# Altium footprint library ICs_rus.PCBLIB: 103 footprints (part 4 of 7)
Each footprint in its own frame and in the unit in brackets; x right, y up, seen from the top. Pads: shape width x height; smd on the part's side, far side on the other; paste and mask are expansions set on the pad; w line width, h text height; cw(c..) or ccw(c..) is an arc to the next point about the centre after c.
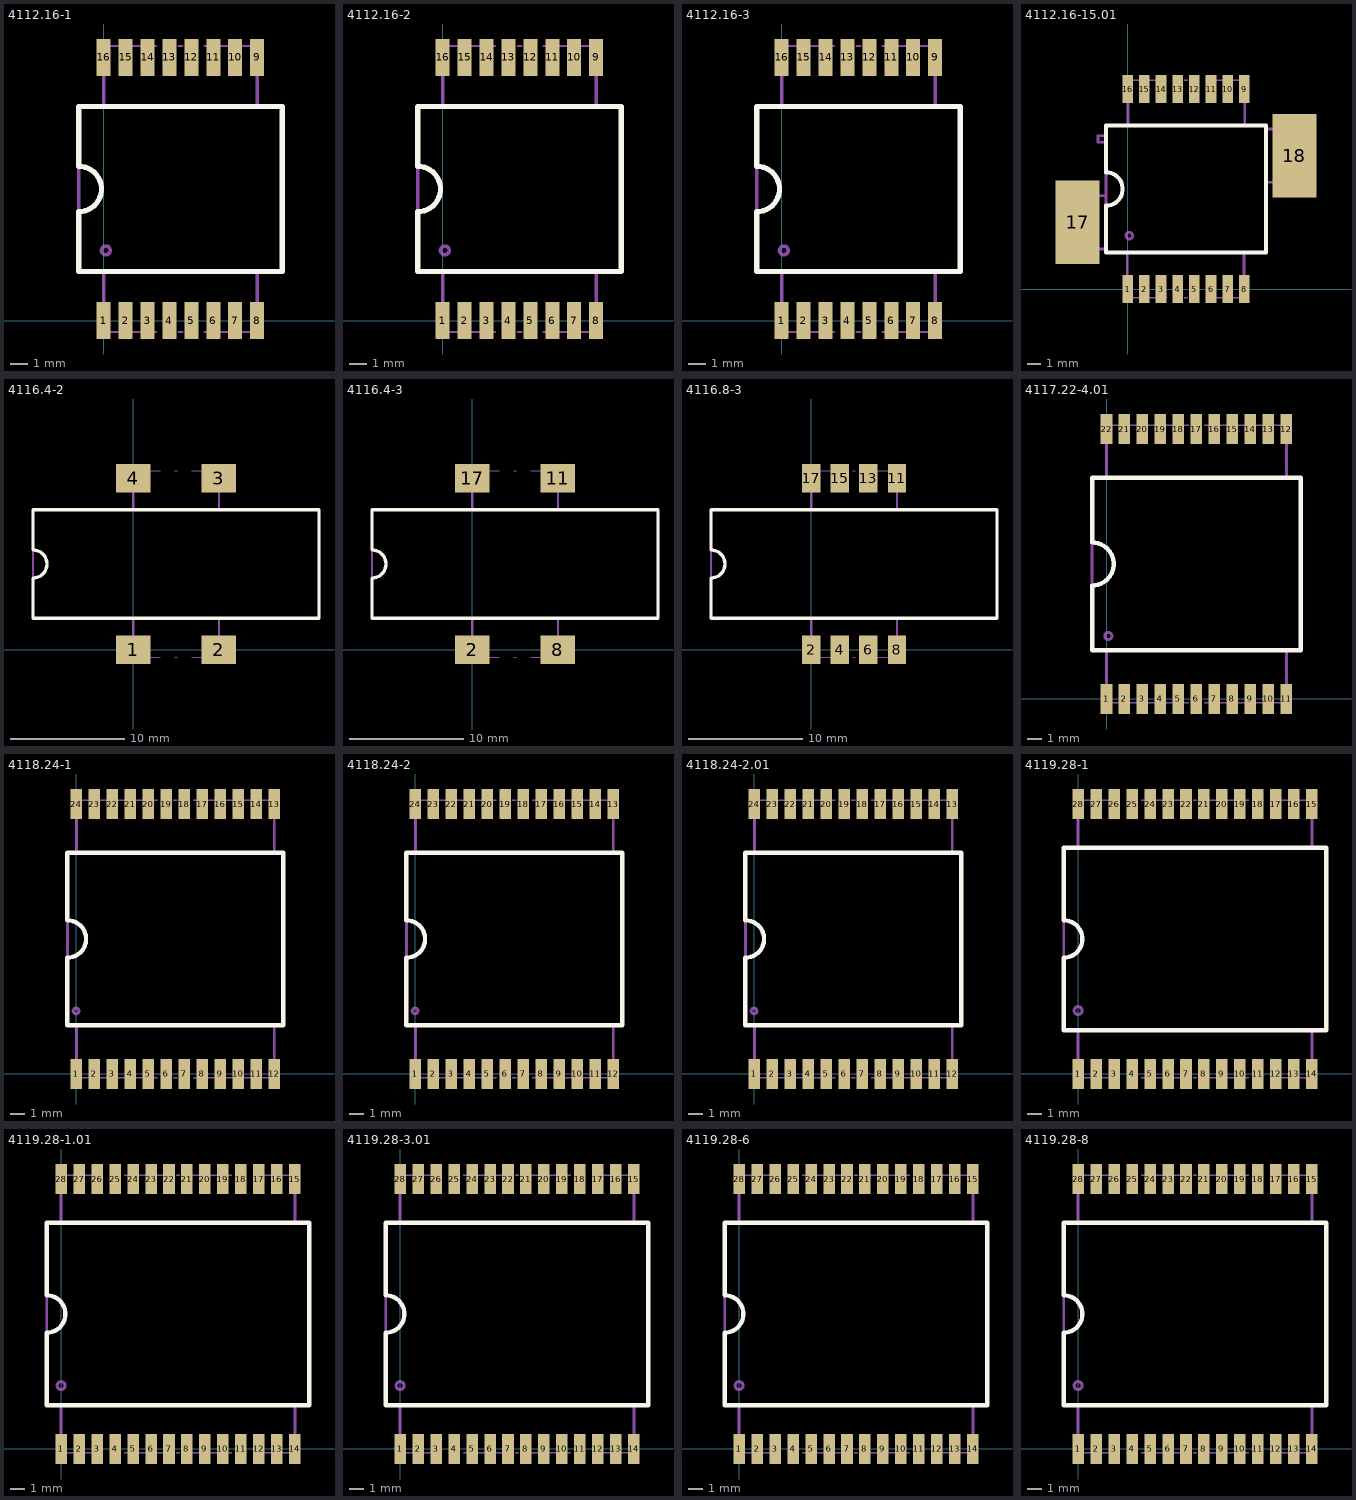
[diagram p3: the footprints below, top view; thin cyan lines are the x and y axes]

## 4112.16-1 [mm]
pads (16):
  rect 0.8x2.1 smd: 1(0,0) 2(1.25,0) 3(2.5,0) 4(3.75,0) 5(5,0) 6(6.25,0) 7(7.5,0) 8(8.75,0) 9(8.75,15) 10(7.5,15) 11(6.25,15) 12(5,15) 13(3.75,15) 14(2.5,15) 15(1.25,15) 16(0,15)
Top Overlay:
  lines w0.3: -1.425,2.8 -1.425,6.2 ccw(c-1.425,7.5) -1.425,8.8 -1.425,12.2 10.175,12.2 10.175,2.8 -1.425,2.8
Mechanical 1:
  circle w0.2: c0.125,4 r0.25
  lines w0.1: 0,-0.65 3,-0.65 ; 0,15.65 3,15.65 ; 4.25,-0.65 4.5,-0.65 ; 4.25,15.65 4.5,15.65 ; 5.75,-0.65 8.75,-0.65 ; 5.75,15.65 8.75,15.65
  lines w0.2: 0,-0.65 0,2.75 ; 0,12.2 0,15.65 ; 8.75,-0.65 8.75,2.75 ; 8.75,12.2 8.75,15.65 ; 10.175,12.175 10.175,2.8 -1.425,2.8 -1.425,12.2 10.175,12.2
  text ".Designator" at 3,8.2 h1.5
  text ".Comment" at 1.1,6.1 h1.5
  text "16" at -0.198,12.946 h1.5
3D body: height 2.8, standoff 0, extent -1.4,-0.6 10.2,15.7

## 4112.16-2 [mm]
pads (16):
  rect 0.8x2.1 smd: 1(0,0) 2(1.25,0) 3(2.5,0) 4(3.75,0) 5(5,0) 6(6.25,0) 7(7.5,0) 8(8.75,0) 9(8.75,15) 10(7.5,15) 11(6.25,15) 12(5,15) 13(3.75,15) 14(2.5,15) 15(1.25,15) 16(0,15)
Top Overlay:
  lines w0.3: -1.425,2.8 10.175,2.8 10.175,12.2 -1.425,12.2 -1.425,8.8 cw(c-1.425,7.5) -1.425,6.2 -1.425,2.8
Mechanical 1:
  circle w0.2: c0.125,4 r0.25
  lines w0.1: 0,-0.65 3,-0.65 ; 0,15.65 3,15.65 ; 4.25,-0.65 4.5,-0.65 ; 4.25,15.65 4.5,15.65 ; 5.75,-0.65 8.75,-0.65 ; 5.75,15.65 8.75,15.65
  lines w0.2: 0,-0.65 0,2.75 ; 0,12.2 0,15.65 ; 8.75,-0.65 8.75,2.75 ; 8.75,12.2 8.75,15.65 ; 10.175,12.175 10.175,2.8 -1.425,2.8 -1.425,12.2 10.175,12.2
  text ".Designator" at 3.6,8.3 h1.5
  text ".Comment" at 1.7,6.2 h1.5
  text "16" at 0.126,12.493 h1.5
3D body: height 2.8, standoff 0, extent -1.4,-0.6 10.2,15.7

## 4112.16-3 [mm]
pads (16):
  rect 0.8x2.1 smd: 1(0,0) 2(1.25,0) 3(2.5,0) 4(3.75,0) 5(5,0) 6(6.25,0) 7(7.5,0) 8(8.75,0) 9(8.75,15) 10(7.5,15) 11(6.25,15) 12(5,15) 13(3.75,15) 14(2.5,15) 15(1.25,15) 16(0,15)
Top Overlay:
  lines w0.3: -1.425,2.8 10.175,2.8 10.175,12.2 -1.425,12.2 -1.425,8.8 cw(c-1.425,7.5) -1.425,6.2 -1.425,2.8
Mechanical 1:
  circle w0.2: c0.125,4 r0.25
  lines w0.1: 0,-0.65 3,-0.65 ; 0,15.65 3,15.65 ; 4.25,-0.65 4.5,-0.65 ; 4.25,15.65 4.5,15.65 ; 5.75,-0.65 8.75,-0.65 ; 5.75,15.65 8.75,15.65
  lines w0.2: 0,-0.65 0,2.75 ; 0,12.2 0,15.65 ; 8.75,-0.65 8.75,2.75 ; 8.75,12.2 8.75,15.65 ; 10.175,12.175 10.175,2.8 -1.425,2.8 -1.425,12.2 10.175,12.2
  text ".Designator" at 3.2,8.3 h1.5
  text ".Comment" at 1.3,6.2 h1.5
  text "16" at -0.198,12.946 h1.5
3D body: height 2.8, standoff 0, extent -1.4,-0.6 10.2,15.7

## 4112.16-15.01 [mm]
pads (18):
  rect 0.8x2.1 smd: 1(0,0) 2(1.25,0) 3(2.5,0) 4(3.75,0) 5(5,0) 6(6.25,0) 7(7.5,0) 8(8.75,0) 9(8.75,15) 10(7.5,15) 11(6.25,15) 12(5,15) 13(3.75,15) 14(2.5,15) 15(1.25,15) 16(0,15)
  rect 3.3x6.25 smd: 17(-3.75,5) 18(12.5,10)
Top Overlay:
  lines w0.3: -1.625,2.75 -1.625,6.25 ccw(c-1.625,7.5) -1.625,8.75 -1.625,12.25 10.375,12.25 10.375,2.75 -1.625,2.75
Mechanical 1:
  circle w0.2: c0.125,4 r0.25
  lines w0.1: -0.025,-0.65 2.925,-0.65 ; 0.025,15.7 0.025,15.65 2.875,15.65 ; 4.225,-0.65 4.525,-0.65 ; 4.225,15.65 4.525,15.65 ; 5.825,15.65 8.775,15.65 ; 5.875,-0.65 8.725,-0.65 8.725,-0.7
  lines w0.2: -1.625,3 -4.125,3 -4.125,7 -1.625,7 ; -1.625,11 -2.225,11 -2.225,11.5 -1.625,11.5 ; -0.025,-0.65 -0.025,2.75 ; 0.025,12.25 0.025,15.65 ; 8.725,-0.65 8.725,2.75 ; 8.775,12.25 8.775,15.65 ; 10.375,8 12.875,8 12.875,12 10.375,12 ; -1.625,2.75 -1.625,12.25 10.375,12.25 10.375,2.75 -1.625,2.75
  text ".Designator" at 3.3,8.1 h1.5
  text ".Comment" at 1.4,6 h1.5
  text "16" at -0.148,12.7 h1.5
3D body: height 3.46, standoff 0, extent -4.1,-0.6 12.9,15.7

## 4116.4-2 [mm]
height 3.35
pads (4):
  rect 3x2.5 smd: 1(0,0) 2(7.5,0) 3(7.5,15) 4(0,15)
Top Overlay:
  lines w0.3: -8.75,2.75 -8.75,6.275 ccw(c-8.75,7.5) -8.75,8.725 -8.75,12.25 16.25,12.25 16.25,2.75 -8.75,2.75
Mechanical 1:
  lines w0.1: 0,-0.65 2.375,-0.65 ; 0,15.65 2.375,15.65 ; 3.625,-0.65 3.875,-0.65 ; 3.625,15.65 3.875,15.65 ; 5.125,-0.65 7.5,-0.65 ; 5.125,15.65 7.5,15.65
  lines w0.2: 0,-0.65 0,2.775 ; 0,12.225 0,15.65 ; 7.5,-0.65 7.5,2.775 ; 7.5,12.225 7.5,15.65 ; -8.75,2.75 -8.75,12.25 16.25,12.25 16.25,2.75 -8.75,2.75
  text "2" at -0.724,3.571 h1.5
  text "17" at -1.448,9.821 h1.5
  text "8" at 6.776,3.571 h1.5
  text "11" at 6.052,9.821 h1.5
  text ".Comment" at -0.6,5.8 h1.5
  text ".Designator" at 1.3,7.9 h1.5
3D body: height 3.1, standoff 0, extent -8.8,-0.7 16.2,15.6

## 4116.4-3 [mm]
pads (4):
  rect 3x2.5 smd: 2(0,0) 8(7.5,0) 11(7.5,15) 17(0,15)
Top Overlay:
  lines w0.3: -8.75,2.75 -8.75,6.275 ccw(c-8.75,7.5) -8.75,8.725 -8.75,12.25 16.25,12.25 16.25,2.75 -8.75,2.75
Mechanical 1:
  lines w0.1: 0,-0.65 2.375,-0.65 ; 0,15.65 2.375,15.65 ; 3.625,-0.65 3.875,-0.65 ; 3.625,15.65 3.875,15.65 ; 5.125,-0.65 7.5,-0.65 ; 5.125,15.65 7.5,15.65
  lines w0.2: 0,-0.65 0,2.775 ; 0,12.225 0,15.65 ; 7.5,-0.65 7.5,2.775 ; 7.5,12.225 7.5,15.65 ; -8.75,2.75 -8.75,12.25 16.25,12.25 16.25,2.75 -8.75,2.75
  text ".Designator" at 1.9,7.8 h1.5
  text ".Comment" at 0,5.7 h1.5
  text "2" at -0.724,3.571 h1.5
  text "17" at -1.448,9.821 h1.5
  text "8" at 6.776,3.571 h1.5
  text "11" at 6.052,9.821 h1.5
3D body: height 3.35, standoff 0, extent -8.7,-0.7 16.3,15.6

## 4116.8-3 [mm]
pads (8):
  rect 1.6x2.5 smd: 2(0,0) 4(2.5,0) 6(5,0) 8(7.5,0) 11(7.5,15) 13(5,15) 15(2.5,15) 17(0,15)
Top Overlay:
  lines w0.3: -8.75,2.75 16.25,2.75 16.25,12.25 -8.75,12.25 -8.75,8.725 cw(c-8.75,7.5) -8.75,6.275 -8.75,2.75
Mechanical 1:
  lines w0.1: 0,-0.65 2.375,-0.65 ; 0,15.65 2.375,15.65 ; 3.625,-0.65 3.875,-0.65 ; 3.625,15.65 3.875,15.65 ; 5.125,-0.65 7.5,-0.65 ; 5.125,15.65 7.5,15.65
  lines w0.2: 0,-0.65 0,2.775 ; 0,12.225 0,15.65 ; 7.5,-0.65 7.5,2.775 ; 7.5,12.225 7.5,15.65 ; -8.75,2.75 16.25,2.75 16.25,12.25 -8.75,12.25 -8.75,2.75
  text "15" at 1.052,9.821 h1.5
  text "4" at 1.776,3.571 h1.5
  text "11" at 6.052,9.821 h1.5
  text "13" at 3.552,9.821 h1.5
  text "8" at 6.776,3.571 h1.5
  text "6" at 4.276,3.571 h1.5
  text "17" at -1.448,9.821 h1.5
  text "2" at -0.724,3.571 h1.5
  text ".Comment" at 0,5.7 h1.5
  text ".Designator" at 1.9,7.8 h1.5
3D body: height 3.35, standoff 0, extent -8.8,-0.7 16.2,15.6

## 4117.22-4.01 [mm]
pads (22):
  rect 0.8x2.1 smd: 1(0,0) 2(1.25,0) 3(2.5,0) 4(3.75,0) 5(5,0) 6(6.25,0) 7(7.5,0) 8(8.75,0) 9(10,0) 10(11.25,0) 11(12.5,0) 12(12.5,18.75) 13(11.25,18.75) 14(10,18.75) 15(8.75,18.75) 16(7.5,18.75) 17(6.25,18.75) 18(5,18.75) 19(3.75,18.75) 20(2.5,18.75) 21(1.25,18.75) 22(0,18.75)
Top Overlay:
  lines w0.3: -1,3.375 -1,7.875 ccw(c-1,9.375) -1,10.875 -1,15.375 ; -1,3.375 13.5,3.375 ; -1,3.375 13.5,3.375 ; -1,15.375 13.5,15.375 ; -1,15.375 13.5,15.375 ; 13.5,3.375 13.5,15.375
Mechanical 1:
  circle w0.2: c0.125,4.375 r0.25
  lines w0.1: 0,-0.275 5.7,-0.275 ; 0,19.025 5.7,19.025 ; 6.1,-0.275 6.4,-0.275 ; 6.1,19.025 6.4,19.025 ; 6.8,-0.275 12.5,-0.275 ; 6.8,19.025 12.5,19.025
  lines w0.2: -1,3.375 -1,15.375 ; 0,-0.275 0,3.375 ; 0,15.375 0,19.025 ; 12.5,-0.275 12.5,3.375 ; 12.5,15.375 12.5,19.025 ; 13.5,3.375 13.5,15.375
  text ".Designator" at 4.8,10.5 h1.5
  text ".Comment" at 2.9,8.4 h1.5
  text "22" at 0.751,15.618 h1.5
3D body: height 3.21, standoff 0, extent -1.2,-0.3 13.8,19

## 4118.24-1 [mm]
pads (24):
  rect 0.8x2.1 smd: 1(0,0) 2(1.25,0) 3(2.5,0) 4(3.75,0) 5(5,0) 6(6.25,0) 7(7.5,0) 8(8.75,0) 9(10,0) 10(11.25,0) 11(12.5,0) 12(13.75,0) 13(13.75,18.75) 14(12.5,18.75) 15(11.25,18.75) 16(10,18.75) 17(8.75,18.75) 18(7.5,18.75) 19(6.25,18.75) 20(5,18.75) 21(3.75,18.75) 22(2.5,18.75) 23(1.25,18.75) 24(0,18.75)
Top Overlay:
  lines w0.3: -0.625,8.05 -0.625,3.375 14.375,3.375 14.375,15.375 -0.625,15.375 -0.625,10.675 cw(c-0.625,9.375) -0.625,8.075
Mechanical 1:
  circle w0.2: c-0.025,4.375 r0.2
  lines w0.1: 0,-0.275 5.625,-0.275 ; 0,19.025 5.625,19.025 ; 6.75,-0.275 7,-0.275 ; 6.75,19.025 7,19.025 ; 8.125,-0.275 13.75,-0.275 ; 8.125,19.025 13.75,19.025
  lines w0.2: 0,-0.275 0,3.375 ; 0,15.375 0,19.025 ; 13.75,-0.275 13.75,3.375 ; 13.75,15.375 13.75,19.025 ; -0.625,3.375 -0.625,15.375 14.375,15.375 14.375,3.375 -0.625,3.375
  text "24" at 0.427,16.696 h1.5
  text ".Comment" at 3.7,8.3 h1.5
  text ".Designator" at 5.6,10.4 h1.5
3D body: height 2.5, standoff 0, extent -0.8,-0.3 14.6,19

## 4118.24-2 [mm]
pads (24):
  rect 0.8x2.1 smd: 1(0,0) 2(1.25,0) 3(2.5,0) 4(3.75,0) 5(5,0) 6(6.25,0) 7(7.5,0) 8(8.75,0) 9(10,0) 10(11.25,0) 11(12.5,0) 12(13.75,0) 13(13.75,18.75) 14(12.5,18.75) 15(11.25,18.75) 16(10,18.75) 17(8.75,18.75) 18(7.5,18.75) 19(6.25,18.75) 20(5,18.75) 21(3.75,18.75) 22(2.5,18.75) 23(1.25,18.75) 24(0,18.75)
Top Overlay:
  lines w0.3: -0.625,8.05 -0.625,3.375 14.375,3.375 14.375,15.375 -0.625,15.375 -0.625,10.675 cw(c-0.625,9.375) -0.625,8.075
Mechanical 1:
  circle w0.2: c-0.025,4.375 r0.2
  lines w0.1: 0,-0.275 5.625,-0.275 ; 0,19.025 5.625,19.025 ; 6.75,-0.275 7,-0.275 ; 6.75,19.025 7,19.025 ; 8.125,-0.275 13.75,-0.275 ; 8.125,19.025 13.75,19.025
  lines w0.2: 0,-0.275 0,3.375 ; 0,15.375 0,19.025 ; 13.75,-0.275 13.75,3.375 ; 13.75,15.375 13.75,19.025 ; -0.625,3.375 14.375,3.375 14.375,15.375 -0.625,15.375 -0.625,3.375
  text ".Designator" at 5.4,10.5 h1.5
  text ".Comment" at 3.5,8.4 h1.5
  text "24" at 0.751,16.243 h1.5
3D body: height 2.5, standoff 0, extent -0.8,-0.3 14.6,19

## 4118.24-2.01 [mm]
pads (24):
  rect 0.8x2.1 smd: 1(0,0) 2(1.25,0) 3(2.5,0) 4(3.75,0) 5(5,0) 6(6.25,0) 7(7.5,0) 8(8.75,0) 9(10,0) 10(11.25,0) 11(12.5,0) 12(13.75,0) 13(13.75,18.75) 14(12.5,18.75) 15(11.25,18.75) 16(10,18.75) 17(8.75,18.75) 18(7.5,18.75) 19(6.25,18.75) 20(5,18.75) 21(3.75,18.75) 22(2.5,18.75) 23(1.25,18.75) 24(0,18.75)
Top Overlay:
  lines w0.3: -0.625,8.05 -0.625,3.375 14.375,3.375 14.375,15.375 -0.625,15.375 -0.625,10.675 cw(c-0.625,9.375) -0.625,8.075
Mechanical 1:
  circle w0.2: c-0.025,4.375 r0.2
  lines w0.1: 0,-0.275 5.625,-0.275 ; 0,19.025 5.625,19.025 ; 6.75,-0.275 7,-0.275 ; 6.75,19.025 7,19.025 ; 8.125,-0.275 13.75,-0.275 ; 8.125,19.025 13.75,19.025
  lines w0.2: 0,-0.275 0,3.375 ; 0,15.375 0,19.025 ; 13.75,-0.275 13.75,3.375 ; 13.75,15.375 13.75,19.025 ; -0.625,3.375 -0.625,15.375 14.375,15.375 14.375,3.375 -0.625,3.375
  text ".Designator" at 5.7,10.3 h1.5
  text ".Comment" at 3.8,8.2 h1.5
  text "24" at 0.751,16.243 h1.5
3D body: height 2.5, standoff 0, extent -0.8,-0.3 14.6,19

## 4119.28-1 [mm]
pads (28):
  rect 0.8x2.1 smd: 1(0,0) 2(1.25,0) 3(2.5,0) 4(3.75,0) 5(5,0) 6(6.25,0) 7(7.5,0) 8(8.75,0) 9(10,0) 10(11.25,0) 11(12.5,0) 12(13.75,0) 13(15,0) 14(16.25,0) 15(16.25,18.75) 16(15,18.75) 17(13.75,18.75) 18(12.5,18.75) 19(11.25,18.75) 20(10,18.75) 21(8.75,18.75) 22(7.5,18.75) 23(6.25,18.75) 24(5,18.75) 25(3.75,18.75) 26(2.5,18.75) 27(1.25,18.75) 28(0,18.75)
Top Overlay:
  lines w0.3: -1,3.025 -1,8.075 ccw(c-1,9.375) -1,10.675 -1,15.725 17.25,15.725 17.25,3.025 -1,3.025
Mechanical 1:
  circle w0.2: c0,4.4 r0.275
  lines w0.1: 0,-0.275 2.625,-0.275 ; 0,19.025 2.625,19.025 ; 3.375,-0.275 3.625,-0.275 ; 3.375,19.025 3.625,19.025 ; 4.375,-0.275 7.125,-0.275 ; 4.375,19.025 7.125,19.025 ; 8,-0.275 8.25,-0.275 ; 8,19.025 8.25,19.025 ; 9.125,-0.275 11.875,-0.275 ; 9.125,19.025 11.875,19.025 ; 12.625,-0.275 12.875,-0.275 ; 12.625,19.025 12.875,19.025 ; 13.625,-0.275 16.25,-0.275 ; 13.625,19.025 16.25,19.025
  lines w0.2: 0,-0.275 0,3.025 ; 0,15.725 0,19.025 ; 16.25,-0.275 16.25,3.025 ; 16.25,15.725 16.25,19.025 ; -1,3.025 -1,15.725 17.25,15.725 17.25,3.025 -1,3.025
  text "28" at 0.427,16.696 h1.5
  text ".Comment" at 4.6,8.1 h1.5
  text ".Designator" at 6.5,10.2 h1.5
3D body: height 2.5, standoff 0, extent -1,-0.3 17.25,19

## 4119.28-1.01 [mm]
pads (28):
  rect 0.8x2.1 smd: 1(0,0) 2(1.25,0) 3(2.5,0) 4(3.75,0) 5(5,0) 6(6.25,0) 7(7.5,0) 8(8.75,0) 9(10,0) 10(11.25,0) 11(12.5,0) 12(13.75,0) 13(15,0) 14(16.25,0) 15(16.25,18.75) 16(15,18.75) 17(13.75,18.75) 18(12.5,18.75) 19(11.25,18.75) 20(10,18.75) 21(8.75,18.75) 22(7.5,18.75) 23(6.25,18.75) 24(5,18.75) 25(3.75,18.75) 26(2.5,18.75) 27(1.25,18.75) 28(0,18.75)
Top Overlay:
  lines w0.3: -1,3.025 17.25,3.025 17.25,15.725 -1,15.725 -1,10.675 cw(c-1,9.375) -1,8.075 -1,3.025
Mechanical 1:
  circle w0.2: c0,4.4 r0.275
  lines w0.1: 0,-0.275 2.625,-0.275 ; 0,19.025 2.625,19.025 ; 3.375,-0.275 3.625,-0.275 ; 3.375,19.025 3.625,19.025 ; 4.375,-0.275 7.125,-0.275 ; 4.375,19.025 7.125,19.025 ; 8,-0.275 8.25,-0.275 ; 8,19.025 8.25,19.025 ; 9.125,-0.275 11.875,-0.275 ; 9.125,19.025 11.875,19.025 ; 12.625,-0.275 12.875,-0.275 ; 12.625,19.025 12.875,19.025 ; 13.625,-0.275 16.25,-0.275 ; 13.625,19.025 16.25,19.025
  lines w0.2: 0,-0.275 0,3.025 ; 0,15.725 0,19.025 ; 16.25,-0.275 16.25,3.025 ; 16.25,15.725 16.25,19.025 ; -1,3.025 17.25,3.025 17.25,15.725 -1,15.725 -1,3.025
  text ".Designator" at 6.8,10.1 h1.5
  text ".Comment" at 4.9,8 h1.5
  text "28" at 0.751,16.243 h1.5
3D body: height 2.5, standoff 0, extent -1,-0.3 17.25,19

## 4119.28-3.01 [mm]
pads (28):
  rect 0.8x2.1 smd: 1(0,0) 2(1.25,0) 3(2.5,0) 4(3.75,0) 5(5,0) 6(6.25,0) 7(7.5,0) 8(8.75,0) 9(10,0) 10(11.25,0) 11(12.5,0) 12(13.75,0) 13(15,0) 14(16.25,0) 15(16.25,18.75) 16(15,18.75) 17(13.75,18.75) 18(12.5,18.75) 19(11.25,18.75) 20(10,18.75) 21(8.75,18.75) 22(7.5,18.75) 23(6.25,18.75) 24(5,18.75) 25(3.75,18.75) 26(2.5,18.75) 27(1.25,18.75) 28(0,18.75)
Top Overlay:
  lines w0.3: -1,3.025 17.25,3.025 17.25,15.725 -1,15.725 -1,10.675 cw(c-1,9.375) -1,8.075 -1,3.025
Mechanical 1:
  circle w0.2: c0,4.4 r0.275
  lines w0.1: 0,-0.275 2.625,-0.275 ; 0,19.025 2.625,19.025 ; 3.375,-0.275 3.625,-0.275 ; 3.375,19.025 3.625,19.025 ; 4.375,-0.275 7.125,-0.275 ; 4.375,19.025 7.125,19.025 ; 8,-0.275 8.25,-0.275 ; 8,19.025 8.25,19.025 ; 9.125,-0.275 11.875,-0.275 ; 9.125,19.025 11.875,19.025 ; 12.625,-0.275 12.875,-0.275 ; 12.625,19.025 12.875,19.025 ; 13.625,-0.275 16.25,-0.275 ; 13.625,19.025 16.25,19.025
  lines w0.2: 0,-0.275 0,3.025 ; 0,15.725 0,19.025 ; 16.25,-0.275 16.25,3.025 ; 16.25,15.725 16.25,19.025 ; -1,3.025 17.25,3.025 17.25,15.725 -1,15.725 -1,3.025
  text ".Designator" at 6.5,10.2 h1.5
  text ".Comment" at 4.6,8.1 h1.5
  text "28" at 0.751,16.243 h1.5
3D body: height 3.3, standoff 0, extent -1,-0.3 17.25,19

## 4119.28-6 [mm]
pads (28):
  rect 0.8x2.1 smd: 1(0,0) 2(1.25,0) 3(2.5,0) 4(3.75,0) 5(5,0) 6(6.25,0) 7(7.5,0) 8(8.75,0) 9(10,0) 10(11.25,0) 11(12.5,0) 12(13.75,0) 13(15,0) 14(16.25,0) 15(16.25,18.75) 16(15,18.75) 17(13.75,18.75) 18(12.5,18.75) 19(11.25,18.75) 20(10,18.75) 21(8.75,18.75) 22(7.5,18.75) 23(6.25,18.75) 24(5,18.75) 25(3.75,18.75) 26(2.5,18.75) 27(1.25,18.75) 28(0,18.75)
Top Overlay:
  lines w0.3: -1,3.025 -1,8.075 ccw(c-1,9.375) -1,10.675 -1,15.725 17.25,15.725 17.25,3.025 -1,3.025
Mechanical 1:
  circle w0.2: c0,4.4 r0.275
  lines w0.1: 0,-0.275 2.625,-0.275 ; 0,19.025 2.625,19.025 ; 3.375,-0.275 3.625,-0.275 ; 3.375,19.025 3.625,19.025 ; 4.375,-0.275 7.125,-0.275 ; 4.375,19.025 7.125,19.025 ; 8,-0.275 8.25,-0.275 ; 8,19.025 8.25,19.025 ; 9.125,-0.275 11.875,-0.275 ; 9.125,19.025 11.875,19.025 ; 12.625,-0.275 12.875,-0.275 ; 12.625,19.025 12.875,19.025 ; 13.625,-0.275 16.25,-0.275 ; 13.625,19.025 16.25,19.025
  lines w0.2: 0,-0.275 0,3.025 ; 0,15.725 0,19.025 ; 16.25,-0.275 16.25,3.025 ; 16.25,15.725 16.25,19.025 ; -1,3.025 -1,15.725 17.25,15.725 17.25,3.025 -1,3.025
  text ".Designator" at 6,10 h1.5
  text ".Comment" at 4.1,7.9 h1.5
  text "28" at 0.427,16.696 h1.5
3D body: height 3.46, standoff 0, extent -1,-0.3 17.3,19

## 4119.28-8 [mm]
pads (28):
  rect 0.8x2.1 smd: 1(0,0) 2(1.25,0) 3(2.5,0) 4(3.75,0) 5(5,0) 6(6.25,0) 7(7.5,0) 8(8.75,0) 9(10,0) 10(11.25,0) 11(12.5,0) 12(13.75,0) 13(15,0) 14(16.25,0) 15(16.25,18.75) 16(15,18.75) 17(13.75,18.75) 18(12.5,18.75) 19(11.25,18.75) 20(10,18.75) 21(8.75,18.75) 22(7.5,18.75) 23(6.25,18.75) 24(5,18.75) 25(3.75,18.75) 26(2.5,18.75) 27(1.25,18.75) 28(0,18.75)
Top Overlay:
  lines w0.3: -1,3.025 17.25,3.025 17.25,15.725 -1,15.725 -1,10.675 cw(c-1,9.375) -1,8.075 -1,3.025
Mechanical 1:
  circle w0.2: c0,4.4 r0.275
  lines w0.1: 0,-0.275 2.625,-0.275 ; 0,19.025 2.625,19.025 ; 3.375,-0.275 3.625,-0.275 ; 3.375,19.025 3.625,19.025 ; 4.375,-0.275 7.125,-0.275 ; 4.375,19.025 7.125,19.025 ; 8,-0.275 8.25,-0.275 ; 8,19.025 8.25,19.025 ; 9.125,-0.275 11.875,-0.275 ; 9.125,19.025 11.875,19.025 ; 12.625,-0.275 12.875,-0.275 ; 12.625,19.025 12.875,19.025 ; 13.625,-0.275 16.25,-0.275 ; 13.625,19.025 16.25,19.025
  lines w0.2: 0,-0.275 0,3.025 ; 0,15.725 0,19.025 ; 16.25,-0.275 16.25,3.025 ; 16.25,15.725 16.25,19.025 ; -1,3.025 17.25,3.025 17.25,15.725 -1,15.725 -1,3.025
  text ".Designator" at 6.4,10.1 h1.5
  text ".Comment" at 4.5,8 h1.5
  text "28" at 0.751,16.243 h1.5
3D body: height 3.46, standoff 0, extent -1,-0.3 17.3,19